# Altium footprint library ZS-005.PcbLib: 30 footprints (part 2 of 2)
Each footprint in its own frame and in the unit in brackets; x right, y up, seen from the top. Pads: shape width x height; smd on the part's side, far side on the other; paste and mask are expansions set on the pad; w line width, h text height; cw(c..) or ccw(c..) is an arc to the next point about the centre after c.
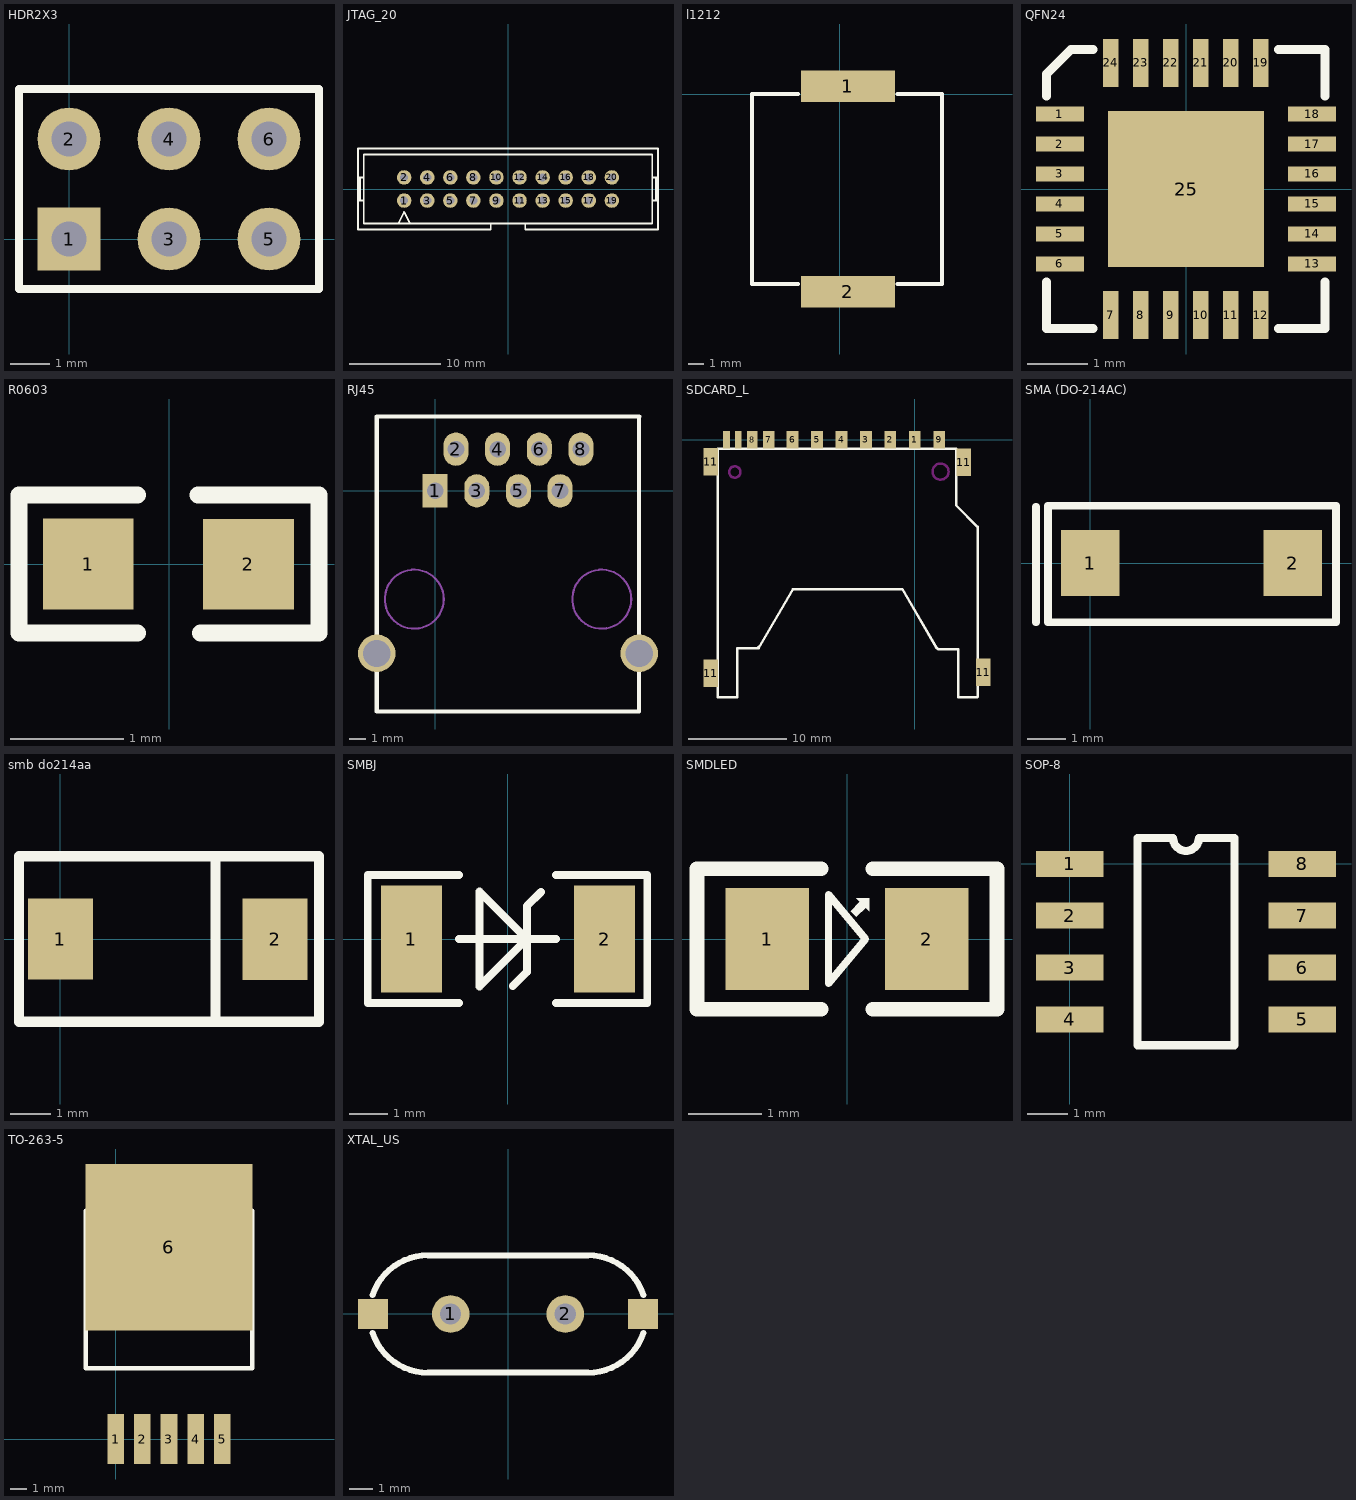
[diagram p1: the footprints below, top view; thin cyan lines are the x and y axes]

## HDR2X3 [mm]
pads (6):
  rect 1.6x1.6 hole 0.9: 1(0,0)
  round 1.6 hole 0.9: 2(0,2.54) 3(2.54,0) 4(2.54,2.54) 5(5.08,0) 6(5.08,2.54)
Top Overlay:
  lines w0.2: 1.482,-1.27 6.35,-1.27 ; 6.35,-1.27 -1.27,-1.27 -1.27,3.81 6.35,3.81 6.35,-1.27
3D body "User Library-PLD-6.step": height 8.4, standoff -3, extent -1.27,-1.23 6.35,3.77

## JTAG_20 [mm]
pads (20):
  round 1.6 hole 0.9: 1(-11.43,-1.27) 2(-11.43,1.27) 3(-8.89,-1.27) 4(-8.89,1.27) 5(-6.35,-1.27) 6(-6.35,1.27) 7(-3.81,-1.27) 8(-3.81,1.27) 9(-1.27,-1.27) 10(-1.27,1.27) 11(1.27,-1.27) 12(1.27,1.27) 13(3.81,-1.27) 14(3.81,1.27) 15(6.35,-1.27) 16(6.35,1.27) 17(8.89,-1.27) 18(8.89,1.27) 19(11.43,-1.27) 20(11.43,1.27)
Top Overlay:
  lines w0.203: -16.51,-1.27 -15.875,-1.27 ; -16.51,1.27 -15.875,1.27 ; -16.298,-1.27 -16.298,1.27 ; -12.065,-3.81 -11.43,-2.54 -10.795,-3.81 ; -8.625,-4.445 -1.905,-4.445 -1.905,-3.81 ; -8.255,-4.445 -16.51,-4.445 -16.51,4.445 16.51,4.445 16.51,-4.445 8.255,-4.445 1.905,-4.445 1.905,-3.81 ; 15.875,-1.27 16.51,-1.27 ; 15.875,1.27 16.51,1.27 ; 16.298,-1.27 16.298,1.27 ; -1.905,-3.81 -15.875,-3.81 -15.875,3.81 15.875,3.81 15.875,-3.81 1.905,-3.81 ; -1.905,-3.81 1.905,-3.81
3D body "SW3dPS-PinBox Connector_20Pin.STEP": height 10.9, standoff -3, extent -16.439,-4.451 16.561,4.349

## l1212 [mm]
pads (2):
  rect 6x2 smd: 1(0.508,0.508) 2(0.508,-12.608)
Top Overlay:
  lines w0.254: -2.667,-12.1 -5.6,-12.1 -5.6,0 -2.667,0 ; 3.683,-12.1 6.5,-12.1 6.5,0 3.683,0

## QFN24 [mm]
pads (25):
  rect 0.8x0.254 smd: 1(-2.101,1.25) 2(-2.101,0.75) 3(-2.101,0.25) 4(-2.101,-0.25) 5(-2.101,-0.75) 6(-2.101,-1.25) 13(2.101,-1.25) 14(2.101,-0.75) 15(2.101,-0.25) 16(2.101,0.25) 17(2.101,0.75) 18(2.101,1.25)
  rect 0.254x0.8 smd: 7(-1.255,-2.101) 8(-0.755,-2.101) 9(-0.255,-2.101) 10(0.245,-2.101) 11(0.745,-2.101) 12(1.245,-2.101) 19(1.245,2.101) 20(0.745,2.101) 21(0.245,2.101) 22(-0.255,2.101) 23(-0.755,2.101) 24(-1.255,2.101)
  rect 2.6x2.6 smd: 25(0,0)
Top Overlay:
  lines w0.15: -2.33,-1.55 -2.33,-2.325 -1.555,-2.325 ; -2.33,1.55 -2.33,1.917 -1.921,2.325 -1.555,2.325 ; 1.545,-2.325 2.32,-2.325 2.32,-1.55 ; 1.545,2.325 2.32,2.325 2.32,1.55
3D body "QFN24.step": height 0.9, standoff 0, extent -2.002,-2.002 2.002,2.002

## R0603 [mm]
pads (2):
  rect 0.8x0.8 smd: 1(-0.711,0) 2(0.699,-0.002)
Top Overlay:
  lines w0.15: -0.279,-0.61 -1.321,-0.61 -1.321,0.61 -0.279,0.61 ; 0.254,0.61 1.295,0.61 ; 0.279,-0.61 1.321,-0.61 1.321,0.61
3D body "User Library-RES_1609-0603.STEP": height 0.56, standoff 0, extent -0.85,-0.4 0.85,0.4

## RJ45 [mil]
height 30
pads (10):
  rect 60x80 hole 40: 1(0,0)
  oval 60x80 hole 40: 2(50,100) 3(100,0) 4(150,100) 5(200,0) 6(250,100) 7(300,0) 8(350,100)
  round 90 hole 65: ""(-140,-390) ""(490,-390)
Top Overlay:
  lines w10: -140.16,-530 489.76,-530 489.76,-129.92 489.76,178.5 ; -140,-530 -140.16,-529.84 -140.16,-129.92 -140.16,178.58 ; -140,178.74 -140.16,178.58 ; 490,178.74 489.76,178.5 ; -140.16,178.58 489.69,178.58 489.76,178.5
Mechanical 1:
  circle w5: c-50,-260 r70.8
  circle w5: c400,-260 r70.8
3D body "SW3DPS-RJ-45-DEFAULT.STEP": height 500.39, standoff -86.61, extent -115.66,-504.48 475.68,184.5

## SDCARD_L [mm]
pads (15):
  rect 1.2x1.8 smd: 1(0,0) 2(-2.489,0) 3(-4.983,-0.009) 4(-7.483,-0.009) 5(-9.983,-0.009) 6(-12.483,-0.009) 7(-14.908,-0.009) 9(2.517,-0.009)
  rect 1.1x1.8 smd: 8(-16.612,0)
  rect 0.7x1.8 smd: 10(-18.034,0) 12(-19.253,0)
  rect 1.5x2.8 smd: 11(-20.853,-23.851) 11(-20.853,-2.261) 11(5.004,-2.286) 11(7.01,-23.784)
Top Overlay:
  lines w0.254: -18.158,-21.3 -18.158,-26.3 -20.131,-26.3 -20.131,-0.914 -20.117,-0.9 4.242,-0.9 4.242,-6.71 6.431,-8.899 6.442,-8.899 6.442,-26.273 6.415,-26.3 4.442,-26.3 4.442,-21.402 2.4,-21.402 2.242,-21.244 ; -18.107,-21.294 -16.065,-21.294 -15.907,-21.136 ; -15.958,-21.294 -12.446,-15.3 ; -12.458,-15.3 -1.258,-15.3 2.242,-21.294
Keep-Out Layer:
  circle w0.254: c-18.39,-3.3 r0.58
  circle w0.254: c2.642,-3.26 r0.82
3D body "TF.step": height 3.3, standoff -0.6, extent -20.934,-26.34 7.041,-0.09

## SMA (DO-214AC) [mm]
pads (2):
  rect 1.5x1.7 smd: 1(0,0) 2(5.213,0)
Top Overlay:
  lines w0.2: -1.397,-1.524 -1.397,1.448 ; -1.089,-1.524 -1.089,-0.054 -1.089,1.473 6.327,1.473 6.327,-1.524 -1.089,-1.524

## smb do214aa [mm]
pads (2):
  rect 1.6x2 smd: 1(0,0) 2(5.273,-0.003)
Top Overlay:
  lines w0.254: 3.81,-2.032 3.81,2.032 ; -1.016,-2.032 6.35,-2.032 6.35,0 6.35,2.032 -1.016,2.032 -1.016,0 -1.016,-2.032

## SMBJ [mm]
pads (2):
  rect 1.6x2.8 smd: 1(-2.515,0) 2(2.54,0)
Top Overlay:
  lines w0.203: -1.27,-1.676 -3.658,-1.676 -3.658,1.676 -1.27,1.676 ; -1.27,0 1.27,0 ; -0.737,1.245 -0.737,-1.245 0.508,0 -0.724,1.232 ; 0.14,-1.232 0.508,-0.864 0.508,0.864 0.876,1.232 ; 1.27,-1.676 3.658,-1.676 3.658,1.676 1.27,1.676
3D body "User Library-S1G.STEP": height 2.12, standoff -0.02, extent -2.527,-1.333 2.578,1.334

## SMDLED [mil]
pads (2):
  rect 45x55 smd: 1(-43,0) 2(43,0)
Top Overlay:
  region: 2,15 7,20 5,22 12,22 12,15 10,17 5,12
  lines w3.94: -10,-24 10,0 -10,24 -10,-24
  lines w7.87: -14,-38 -81,-38 -81,38 -14,38 ; 14,-38 81,-38 81,38 14,38
3D body "led0805  green.step": height 43.31, standoff -0.5, extent -40,-25 40,25

## SOP-8 [mil]
pads (8):
  rect 65x25 smd: 1(0,0) 2(0,-50) 3(0,-100) 4(0,-150) 5(224.41,-150) 6(224.41,-100) 7(224.41,-50) 8(224.41,0)
Top Overlay:
  lines w7.87: 65.37,-175 159.04,-175 159.04,25 124.7,25 cw(c112.2,25) 99.7,25 65.37,25 65.37,-175
3D body "SOP8.STEP": height 62.99, standoff 0, extent -7.7,-172.62 230.17,25.02

## TO-263-5 [mm]
pads (6):
  rect 1x3 smd: 1(0,0) 2(1.6,0) 3(3.2,0) 4(4.8,0) 5(6.4,0)
  rect 10x10 smd: 6(3.2,11.5)
Top Overlay:
  lines w0.254: -1.8,4.242 -1.8,13.7 8.2,13.7 8.2,4.242 -1.8,4.242

## XTAL_US [mm]
pads (4):
  round 1.6 hole 0.9: 1(-2.44,0) 2(2.44,0)
  rect 1.27x1.27 smd: ""(-5.75,0) ""(5.75,0)
Top Overlay:
  lines w0.254: -5.766,-0.809 ccw(c-3.4,0) -3.4,-2.5 ; -5.766,0.809 cw(c-3.4,0) -3.4,2.5 3.4,2.5 cw(c3.4,0) 5.765,0.809 ; -3.405,-2.5 3.4,-2.5 ccw(c3.4,0) 5.765,-0.809
3D body "hc-49s_y.stp": height 3.5, standoff -3, extent -5.39,-2.255 5.41,2.245